# Altium footprint library BARKO_PCBLIB.PcbLib: 531 footprints (part 23 of 34)
Each footprint in its own frame and in the unit in brackets; x right, y up, seen from the top. Pads: shape width x height; smd on the part's side, far side on the other; paste and mask are expansions set on the pad; w line width, h text height; cw(c..) or ccw(c..) is an arc to the next point about the centre after c.
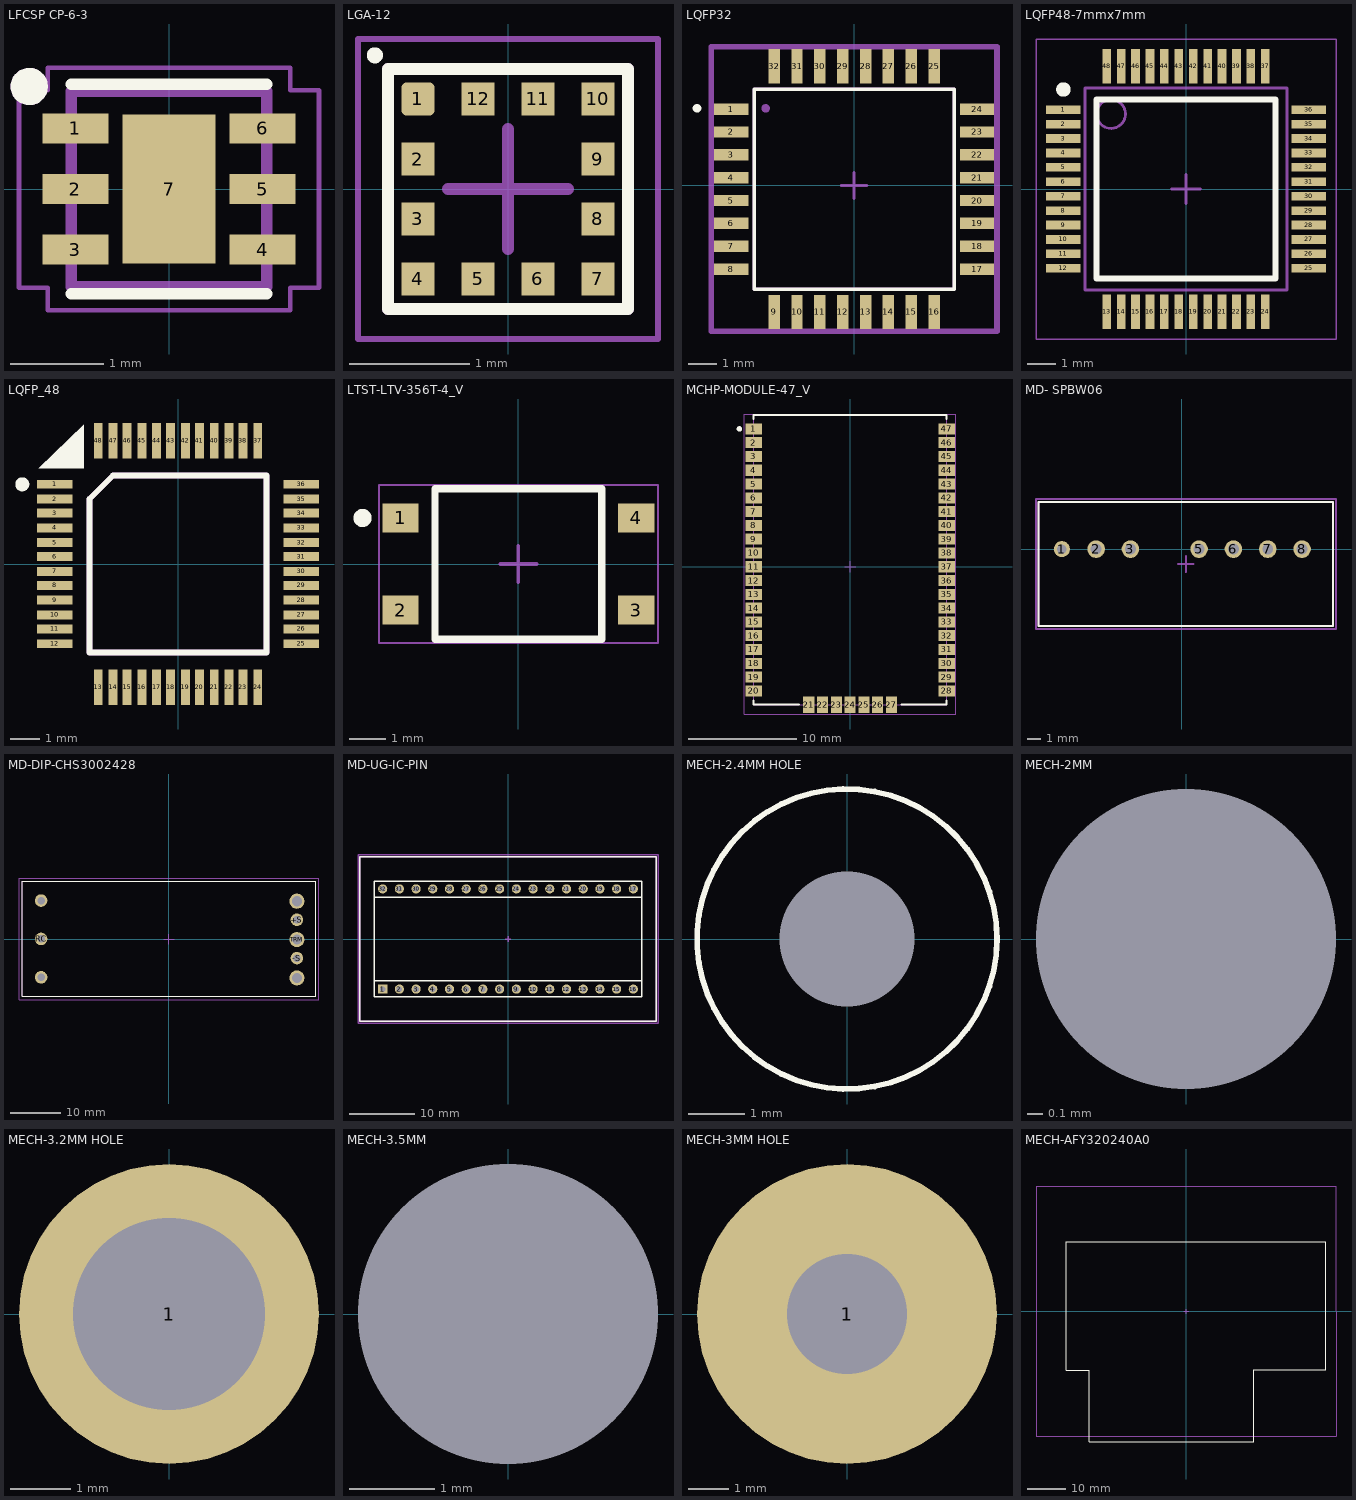
[diagram p22: the footprints below, top view; thin cyan lines are the x and y axes]

## LFCSP CP-6-3 [mm] "6-Lead Lead Frame Chip Scale Package [LFCSP]  2.00 mm × 2.00 mm Body and 0.55 mm Package Height"
height 0.6
pads (7):
  rect 0.71x0.32 smd: 1(-1.005,0.65) 2(-1.005,0) 3(-1.005,-0.65) 4(1.005,-0.65) 5(1.005,0) 6(1.005,0.65)
  rect 1x1.6 smd paste-2: 7(0,0)
Top Overlay:
  circle w0.2: c-1.5,1.1 r0.1
  lines w0.127: -1.05,-1.124 1.05,-1.124 ; -1.05,1.124 1.05,1.124
Top Paste:
  region: 0.32,-0.68 -0.32,-0.68 -0.32,-0.06 0.32,-0.06
  region: 0.32,0.06 -0.32,0.06 -0.32,0.68 0.32,0.68
Mechanical 15:
  lines w0.05: -1.61,-1.06 -1.3,-1.06 -1.3,-1.3 1.3,-1.3 1.3,-1.06 1.61,-1.06 1.61,1.06 1.3,1.06 1.3,1.3 -1.3,1.3 -1.3,1.06 -1.61,1.06 -1.61,-1.06
ASM Top:
  circle w0.2: c-1.5,1.1 r0.1
  lines w0.127: -1.05,-1.05 -1.05,1.05 1.05,1.05 1.05,-1.05 -1.05,-1.05
  text ".designator" at -0.8,-0.4 h0.8
3D body "LFCSP CP-6-3.step": height 0.6, standoff 0, extent -1.2,-1 1.3,1.1

## LGA-12 [mm] "LGA, 12-Leads, Body 2.00x2.00mmx1.00mm, Pitch 0.50mm"
height 1
pads (12):
  rrect30% 0.275x0.275 smd paste-0.01 mask+0.01: 1(-0.75,0.75)
  rect 0.275x0.275 smd paste-0.01 mask+0.01: 2(-0.75,0.25) 3(-0.75,-0.25) 4(-0.75,-0.75) 5(-0.25,-0.75) 6(0.25,-0.75) 7(0.75,-0.75) 8(0.75,-0.25) 9(0.75,0.25) 10(0.75,0.75) 11(0.25,0.75) 12(-0.25,0.75)
Top Overlay:
  circle w0.1: c-1.109,1.114 r0.017
  lines w0.1: -1,-1 1,-1 1,1 -1,1 -1,-1
Mechanical 15:
  lines w0.05: -1.25,-1.25 1.25,-1.25 1.25,1.25 -1.25,1.25 -1.25,-1.25
  lines w0.1: -0.5,0 0.5,0 ; 0,-0.5 0,0.5
ASM Top:
  lines w0.1: -1,-1 -1,1 1,1 1,-1 -1,-1
  text ".designator" at -0.8,-0.2 h0.8
3D body "User Library-lga-2x2x0_9.step": height 0.95, standoff 0, extent -1,-1 1,1

## LQFP32 [mm]
pads (32):
  rect 1.2x0.4 smd: 1(-4.3,2.673) 2(-4.3,1.873) 3(-4.3,1.073) 4(-4.3,0.273) 5(-4.3,-0.527) 6(-4.3,-1.327) 7(-4.3,-2.127) 8(-4.3,-2.927) 17(4.3,-2.927) 18(4.3,-2.127) 19(4.3,-1.327) 20(4.3,-0.527) 21(4.3,0.273) 22(4.3,1.073) 23(4.3,1.873) 24(4.3,2.673)
  rect 0.4x1.2 smd: 9(-2.8,-4.427) 10(-2,-4.427) 11(-1.2,-4.427) 12(-0.4,-4.427) 13(0.4,-4.427) 14(1.2,-4.427) 15(2,-4.427) 16(2.8,-4.427) 25(2.8,4.173) 26(2,4.173) 27(1.2,4.173) 28(0.4,4.173) 29(-0.4,4.173) 30(-1.2,4.173) 31(-2,4.173) 32(-2.8,4.173)
Top Overlay:
  circle w0.3: c-5.5,2.7 r0.001
  lines w0.127: -3.5,-3.627 3.5,-3.627 3.5,3.373 -3.5,3.373 -3.5,-3.627
Mechanical 15:
  lines w0.1: -0.45,0 0.45,0 ; -0.006,-0.45 -0.006,0.45
  lines w0.2: -5,-5.1 5,-5.1 5,4.853 -5,4.853 -5,-5.1
ASM Top:
  circle w0.3: c-3.1,2.7 r0.001
  lines w0.127: -3.5,-3.627 3.5,-3.627 3.5,3.373 -3.5,3.373 -3.5,-3.627
  text ".designator" at -0.1,-0.1 h0.8
3D body "LQFP32.STEP": height 1.5, standoff 0.02, extent -4.5,-4.6 4.5,4.4

## LQFP48-7mmx7mm [mm] "TSQFP, 48-Leads, Body 7,00x7,00mm, Pitch 0,50mm, IPC Medium Density"
height 1.6
pads (48):
  rect 1.2x0.3 smd mask+0.09: 1(-4.25,2.75) 2(-4.25,2.25) 3(-4.25,1.75) 4(-4.25,1.25) 5(-4.25,0.75) 6(-4.25,0.25) 7(-4.25,-0.25) 8(-4.25,-0.75) 9(-4.25,-1.25) 10(-4.25,-1.75) 11(-4.25,-2.25) 12(-4.25,-2.75) 25(4.25,-2.75) 26(4.25,-2.25) 27(4.25,-1.75) 28(4.25,-1.25) 29(4.25,-0.75) 30(4.25,-0.25) 31(4.25,0.25) 32(4.25,0.75) 33(4.25,1.25) 34(4.25,1.75) 35(4.25,2.25) 36(4.25,2.75)
  rect 0.3x1.2 smd mask+0.09: 13(-2.75,-4.25) 14(-2.25,-4.25) 15(-1.75,-4.25) 16(-1.25,-4.25) 17(-0.75,-4.25) 18(-0.25,-4.25) 19(0.25,-4.25) 20(0.75,-4.25) 21(1.25,-4.25) 22(1.75,-4.25) 23(2.25,-4.25) 24(2.75,-4.25) 37(2.75,4.25) 38(2.25,4.25) 39(1.75,4.25) 40(1.25,4.25) 41(0.75,4.25) 42(0.25,4.25) 43(-0.25,4.25) 44(-0.75,4.25) 45(-1.25,4.25) 46(-1.75,4.25) 47(-2.25,4.25) 48(-2.75,4.25)
Top Overlay:
  circle w0.25: c-4.25,3.45 r0.125
  lines w0.2: -3.1,-3.1 -3.1,3.1 3.1,3.1 3.1,-3.1 -3.1,-3.1
Mechanical 15:
  lines w0.05: -5.2,-5.2 -5.2,5.2 5.2,5.2 5.2,-5.2 -5.2,-5.2
  lines w0.1: -0.5,0 0.5,0 ; 0,-0.5 0,0.5
ASM Top:
  circle w0.1: c-2.6,2.6 r0.5
  lines w0.1: -3.5,-3.5 3.5,-3.5 3.5,3.5 -3.5,3.5 -3.5,-3.5
  text ".designator" at -0.4,0 h0.8
3D body "LQFP48-7mmx7mm.step": height 1.6, standoff 0, extent -4.5,-4.5 4.5,4.5

## LQFP_48 [mil]
pads (48):
  rect 48x12 smd mask+0: 1(-167,108) 2(-167,88) 3(-167,69) 4(-167,49) 5(-167,29) 6(-167,10) 7(-167,-10) 8(-167,-29) 9(-167,-49) 10(-167,-69) 11(-167,-88) 12(-167,-108) 25(167,-108) 26(167,-88) 27(167,-69) 28(167,-49) 29(167,-29) 30(167,-10) 31(167,10) 32(167,29) 33(167,49) 34(167,69) 35(167,88) 36(167,108)
  rect 12x48 smd mask+0: 13(-108,-167) 14(-88,-167) 15(-69,-167) 16(-49,-167) 17(-29,-167) 18(-10,-167) 19(10,-167) 20(29,-167) 21(49,-167) 22(69,-167) 23(88,-167) 24(108,-167) 37(108,167) 38(88,167) 39(69,167) 40(49,167) 41(29,167) 42(10,167) 43(-10,167) 44(-29,167) 45(-49,167) 46(-69,167) 47(-88,167) 48(-108,167)
Top Overlay:
  circle w10: c-211,108 r4.47
  region: -189,130 -128,130 -128,189
  lines w8: -120,-120 120,-120 120,120 -88,120 -120,88 -120,-120
ASM Top:
  lines w8: -120,-120 -120,88 -88,120 120,120 120,-120 -120,-120
  text ".designator" at -97,-14 h31.5
3D body "SW3dPS-Quad50M48.STEP": height 61.92, standoff 0.5, extent -176.33,-177 178,177.33

## LTST-LTV-356T-4_V [mm] "SMD, 4-Leads, Body 4.6x4.15mm, Pitch 2.54mm"
height 2.32
pads (4):
  rect 1x0.8 smd: 1(-3.25,1.27) 2(-3.25,-1.27) 3(3.25,-1.27) 4(3.25,1.27)
Top Overlay:
  circle w0.25: c-4.3,1.27 r0.125
  lines w0.2: -2.3,-2.075 2.3,-2.075 2.3,2.075 -2.3,2.075 -2.3,-2.075
Mechanical 15:
  lines w0.05: -3.85,-2.175 3.85,-2.175 3.85,2.175 -3.85,2.175 -3.85,-2.175
  lines w0.1: -0.5,0 0.5,0 ; 0,-0.5 0,0.5
ASM Top:
  lines w0.1: -2.3,-2.075 2.3,-2.075 2.3,2.075 -2.3,2.075 -2.3,-2.075
  text ".designator" at -0.436,0 h0.8
3D body "User Library-SOP254P665X290.STEP": height 2.9, standoff 0, extent -3.277,-2.489 3.409,2.461

## MCHP-MODULE-47_V [mil] "SMD, 47-Leads, Body 26.67x17.78mm, Pitch 1.27mm"
height 131.5
pads (47):
  rect 60x40 smd mask+3.94: 1(-350,500) 2(-350,450) 3(-350,400) 4(-350,350) 5(-350,300) 6(-350,250) 7(-350,200) 8(-350,150) 9(-350,100) 10(-350,50) 11(-350,0) 12(-350,-50) 13(-350,-100) 14(-350,-150) 15(-350,-200) 16(-350,-250) 17(-350,-300) 18(-350,-350) 19(-350,-400) 20(-350,-450) 28(350,-450) 29(350,-400) 30(350,-350) 31(350,-300) 32(350,-250) 33(350,-200) 34(350,-150) 35(350,-100) 36(350,-50) 37(350,0) 38(350,50) 39(350,100) 40(350,150) 41(350,200) 42(350,250) 43(350,300) 44(350,350) 45(350,400) 46(350,450) 47(350,500)
  rect 40x60 smd mask+3.94: 21(-150,-500) 22(-100,-500) 23(-50,-500) 24(0,-500) 25(50,-500) 26(100,-500) 27(150,-500)
Top Overlay:
  circle w9.84: c-401.65,500 r4.92
  lines w7.87: -350,-485.75 -350,-500 -185.75,-500 ; -350,535.75 -350,550 350,550 350,535.75 ; 185.75,-500 350,-500 350,-485.75
Mechanical 15:
  lines w1.97: -383.94,-533.94 -383.94,553.94 383.94,553.94 383.94,-533.94 -383.94,-533.94
  lines w3.94: -19.68,0 19.69,0 ; 0,-19.68 0,19.68
ASM Top:
  lines w3.94: -350,-500 350,-500 350,550 -350,550 -350,-500
  text ".designator" at -74.8,0 h31.5
3D body "User Library-RN2483-1.STEP": height 131.5, standoff -0.04, extent -350,-500 350,550

## MD- SPBW06 [mm]
height 11.1
pads (7):
  round 1.2 hole 0.7 mask+0.05: 1(-8.89,0)
  round 1.3 hole 0.8 mask+0.05: 2(-6.35,0) 3(-3.81,0) 5(1.27,0) 6(3.81,0) 7(6.35,0) 8(8.89,0)
Top Overlay:
  lines w0.15: -10.614,-5.7 11.186,-5.7 11.186,3.5 -10.614,3.5 -10.614,-5.7
Mechanical 15:
  lines w0.15: -0.3,-1.1 0.286,-1.1 ; 0.286,-0.514 0.286,-1.1 ; 0.3,-1.7 0.286,-1.686 0.286,-1.1 ; 0.871,-1.1 0.286,-1.1 ; -10.8,-5.9 -10.8,3.7 11.4,3.7 11.4,-5.9 -10.8,-5.9
ASM Top:
  lines w0.15: -10.614,-5.7 -10.614,3.5 11.186,3.5 11.186,-5.7 -10.614,-5.7
  text ".designator" at -0.5,-1.1 h1.5
3D body "SPBW06.STEP": height 11.11, standoff -4.09, extent -10.614,-5.7 11.186,3.5

## MD-DIP-CHS3002428 [mm]
height 11
pads (8):
  round 2.5 hole 1.5 unplated: +S(25.4,3.874) +VIN(-25.4,7.684) -S(25.4,-3.746) -VIN(-25.4,-7.556) RC(-25.4,0.064)
  round 3 hole 2 unplated: +VOUT(25.4,7.555) -VOUT(25.4,-7.684) TRM(25.4,-0.065)
Top Overlay:
  lines w0.15: -29.2,-11.366 -29.2,11.494 29.2,11.494 29.2,-11.366 -29.2,-11.366
Mechanical 15:
  lines w0.15: -1,0 0,0 ; 0,-1 0,0 ; 0,1 0,0 ; 1,0 0,0 ; -29.8,-12 -29.8,11.75 -29.8,12.1 29.8,12.1 29.8,-12 -29.8,-12
ASM Top:
  lines w0.15: 29.2,-11.366 -29.2,-11.366 -29.2,11.494 29.2,11.494 29.2,-11.366 ; 29.2,-11.366 29.2,-11.366
  text ".designator" at -0.2,-0.1 h1.5
3D body "chs300(stp).stp": height 10.91, standoff -3.17, extent -29.2,-11.366 29.2,11.494

## MD-UG-IC-PIN [mil]
height 433.07
pads (32):
  rect 55x55 / inner round 0 / far side rect 55x55 hole 32: 1(-750,-300)
  round 55 / inner round 0 / far side round 55 hole 32: 2(-650,-300) 3(-550,-300) 4(-450,-300) 5(-350,-300) 6(-250,-300) 7(-150,-300) 8(-50,-300) 9(50,-300) 10(150,-300) 11(250,-300) 12(350,-300) 13(450,-300) 14(550,-300) 15(650,-300) 16(750,-300) 17(750,300) 18(650,300) 19(550,300) 20(450,300) 21(350,300) 22(250,300) 23(150,300) 24(50,300) 25(-50,300) 26(-150,300) 27(-250,300) 28(-350,300) 29(-450,300) 30(-550,300) 31(-650,300) 32(-750,300)
Top Overlay:
  lines w3: -799.21,208.66 -799.21,-208.66 ; 799.21,-208.66 799.21,208.66 ; -799.21,-208.66 -799.21,-346.46 799.21,-346.46 799.21,208.66 ; -799.21,-208.66 -799.21,346.46 799.21,346.46 799.21,208.66
  lines w7.87: -799.21,-250.79 799.21,-250.79 ; -799.21,250.79 799.21,250.79 ; -885.83,-492.13 885.83,-492.13 885.83,492.13 -885.83,492.13 -885.83,-492.13 ; -799.21,-346.46 799.21,-346.46 799.21,346.46 -799.21,346.46 -799.21,-346.46
Mechanical 15:
  lines w7.87: -15.75,0 15.75,0 ; 0,0 0,-15.75 0,15.75 ; -897.64,-503.94 -897.64,503.94 897.64,503.94 897.64,-503.94 893.7,-503.94 -897.64,-503.94
ASM Top:
  lines w7.87: -885.83,-492.13 -885.83,492.13 885.83,492.13 885.83,-492.13 -885.83,-492.13
  text ".designator" at -3.94,9.41 h31.5
3D body: height 62.99, standoff 0, extent -885.83,-492.13 885.83,492.13

## MECH-2.4MM HOLE [mm]
pads (1):
  round 0.1 hole 2.4 unplated: 1(0,0)
Top Overlay:
  circle w0.102: c0,0 r2.67

## MECH-2MM [mil]
pads (1):
  round 1 hole 78 unplated: 1(0,0)

## MECH-3.2MM HOLE [mm]
pads (1):
  round 5 hole 3.2: 1(0,0)
3D body "M3x6_MB_Civata.STEP": height 2.46, standoff -5.9, extent -2.8,-2.8 2.803,2.8

## MECH-3.5MM [mil]
pads (1):
  round 1 hole 137.8 unplated: 1(0,0)

## MECH-3MM HOLE [mm]
pads (1):
  round 7.5 hole 3: 1(0,0)

## MECH-AFY320240A0 [mm]
height 2.77
Top Overlay:
  lines w0.2: -31,-15.22 -24.98,-15.22 -24.98,-33.7 -11.633,-33.7 15.092,-33.7 17.45,-33.7 17.45,-32.266 17.45,-15.066 36,-15.066 36,17.934 -31,17.934 -31,-15.22
Mechanical 15:
  lines w0.2: -0.6,0 0.6,0 ; 0,-0.6 0,0.6 ; -38.8,-32.266 38.7,-32.266 38.7,32.334 -38.8,32.334 -38.8,-32.266
3D body "EVE3-35A-TPR.step": height 4.41, standoff -3.52, extent -38.5,-33.666 38.4,32.334